# Altium schematic symbol library jlcpcb_2025_04_resistors_extended_0201.schlib: 1508 symbols (part 8 of 8) (continued)
## WR02X220JTL
designator R?  Resistance: 22Ω  (hidden comment: *)
Resistor, 22Ω, ±5%, 50mW, ±100ppm/℃, SMD 0201; Manufacturer: Uniroyal; Manufacturer Part Number: WR02X220JTL; Supplier 1: LCSC; Supplier Part Number 1: C367537; JLCPCB Part Number: C367537; Power Rating: 50mW; Category: Resistors; Package Size: 0201; JLCPCB Basic Part: Yes; Tolerance: ±5%; Temperature Coefficient: ±100ppm/℃; ComponentLink1Description: Datasheet; ComponentLink1URL: https://wmsc.lcsc.com/wmsc/upload/file/pdf/v2/lcsc/2304140030_Walsin-Tech-Corp-WR02X220JTL_C367537.pdf; ComponentLink2Description: JLCPCB Part URL; ComponentLink2URL: https://jlcpcb.com/partdetail/C367537
pins: 1, 2
1 alternate drawing of the same symbol

## WR02X221JALV
designator R?  Resistance: 220Ω  (hidden comment: *)
Resistor, 220Ω, ±5%, 50mW, ±200ppm/℃, SMD 0201; Manufacturer: Uniroyal; Manufacturer Part Number: WR02X221JALV; Supplier 1: LCSC; Supplier Part Number 1: C880848; JLCPCB Part Number: C880848; Power Rating: 50mW; Category: Resistors; Package Size: 0201; JLCPCB Basic Part: Yes; Tolerance: ±5%; Temperature Coefficient: ±200ppm/℃; ComponentLink1Description: Datasheet; ComponentLink1URL: https://wmsc.lcsc.com/wmsc/upload/file/pdf/v2/lcsc/2304140030_Walsin-Tech-Corp-WR02X221JALV_C880848.pdf; ComponentLink2Description: JLCPCB Part URL; ComponentLink2URL: https://jlcpcb.com/partdetail/C880848
pins: 1, 2
1 alternate drawing of the same symbol

## WR02X222JAL
designator R?  Resistance: 2.2kΩ  (hidden comment: *)
Resistor, 2.2kΩ, ±5%, 50mW, 25V, ±200ppm/℃, -55℃~+125℃, SMD 0201; Manufacturer: Uniroyal; Manufacturer Part Number: WR02X222JAL; Supplier 1: LCSC; Supplier Part Number 1: C171950; JLCPCB Part Number: C171950; Power Rating: 50mW; Category: Resistors; Package Size: 0201; JLCPCB Basic Part: Yes; Tolerance: ±5%; Voltage Rating: 25V; Temperature Coefficient: ±200ppm/℃; Temperature Rating: -55℃~+125℃; ComponentLink1Description: Datasheet; ComponentLink1URL: https://wmsc.lcsc.com/wmsc/upload/file/pdf/v2/lcsc/2304140030_Walsin-Tech-Corp-WR02X222JAL_C171950.pdf; ComponentLink2Description: JLCPCB Part URL; ComponentLink2URL: https://jlcpcb.com/partdetail/C171950
pins: 1, 2
1 alternate drawing of the same symbol

## WR02X243JAL
designator R?  Resistance: 24kΩ  (hidden comment: *)
Resistor, 24kΩ, ±5%, 50mW, 25V, ±200ppm/℃, -55℃~+125℃, SMD 0201; Manufacturer: Uniroyal; Manufacturer Part Number: WR02X243JAL; Supplier 1: LCSC; Supplier Part Number 1: C171955; JLCPCB Part Number: C171955; Power Rating: 50mW; Category: Resistors; Package Size: 0201; JLCPCB Basic Part: Yes; Tolerance: ±5%; Voltage Rating: 25V; Temperature Coefficient: ±200ppm/℃; Temperature Rating: -55℃~+125℃; ComponentLink1Description: Datasheet; ComponentLink1URL: https://wmsc.lcsc.com/wmsc/upload/file/pdf/v2/lcsc/2304140030_Walsin-Tech-Corp-WR02X243JAL_C171955.pdf; ComponentLink2Description: JLCPCB Part URL; ComponentLink2URL: https://jlcpcb.com/partdetail/C171955
pins: 1, 2
1 alternate drawing of the same symbol

## WR02X244JAL
designator R?  Resistance: 240kΩ  (hidden comment: *)
Resistor, 240kΩ, ±5%, 50mW, 25V, ±200ppm/℃, -55℃~+125℃, SMD 0201; Manufacturer: Uniroyal; Manufacturer Part Number: WR02X244JAL; Supplier 1: LCSC; Supplier Part Number 1: C334629; JLCPCB Part Number: C334629; Power Rating: 50mW; Category: Resistors; Package Size: 0201; JLCPCB Basic Part: Yes; Tolerance: ±5%; Voltage Rating: 25V; Temperature Coefficient: ±200ppm/℃; Temperature Rating: -55℃~+125℃; ComponentLink1Description: Datasheet; ComponentLink1URL: https://wmsc.lcsc.com/wmsc/upload/file/pdf/v2/lcsc/2304140030_Walsin-Tech-Corp-WR02X244JAL_C334629.pdf; ComponentLink2Description: JLCPCB Part URL; ComponentLink2URL: https://jlcpcb.com/partdetail/C334629
pins: 1, 2
1 alternate drawing of the same symbol

## WR02X303JAL
designator R?  Resistance: 30kΩ  (hidden comment: *)
Resistor, 30kΩ, ±5%, 50mW, ±200ppm/℃, -55℃~+125℃, SMD 0201; Manufacturer: Uniroyal; Manufacturer Part Number: WR02X303JAL; Supplier 1: LCSC; Supplier Part Number 1: C171960; JLCPCB Part Number: C171960; Power Rating: 50mW; Category: Resistors; Package Size: 0201; JLCPCB Basic Part: Yes; Tolerance: ±5%; Temperature Coefficient: ±200ppm/℃; Temperature Rating: -55℃~+125℃; ComponentLink1Description: Datasheet; ComponentLink1URL: https://wmsc.lcsc.com/wmsc/upload/file/pdf/v2/lcsc/2304140030_Walsin-Tech-Corp-WR02X303JAL_C171960.pdf; ComponentLink2Description: JLCPCB Part URL; ComponentLink2URL: https://jlcpcb.com/partdetail/C171960
pins: 1, 2
1 alternate drawing of the same symbol

## WR02X305JAL
designator R?  Resistance: 3MΩ  (hidden comment: *)
Resistor, 3MΩ, ±5%, 50mW, 25V, ±200ppm/℃, -55℃~+125℃, SMD 0201; Manufacturer: Uniroyal; Manufacturer Part Number: WR02X305JAL; Supplier 1: LCSC; Supplier Part Number 1: C2886138; JLCPCB Part Number: C2886138; Power Rating: 50mW; Category: Resistors; Package Size: 0201; JLCPCB Basic Part: Yes; Tolerance: ±5%; Voltage Rating: 25V; Temperature Coefficient: ±200ppm/℃; Temperature Rating: -55℃~+125℃; ComponentLink1Description: Datasheet; ComponentLink1URL: https://wmsc.lcsc.com/wmsc/upload/file/pdf/v2/lcsc/2108170930_Walsin-Tech-Corp-WR02X305JAL_C2886138.pdf; ComponentLink2Description: JLCPCB Part URL; ComponentLink2URL: https://jlcpcb.com/partdetail/C2886138
pins: 1, 2
1 alternate drawing of the same symbol

## WR02X362JAL
designator R?  Resistance: 3.6kΩ  (hidden comment: *)
Resistor, 3.6kΩ, ±5%, 50mW, 25V, ±200ppm/℃, -55℃~+125℃, SMD 0201; Manufacturer: Uniroyal; Manufacturer Part Number: WR02X362JAL; Supplier 1: LCSC; Supplier Part Number 1: C367600; JLCPCB Part Number: C367600; Power Rating: 50mW; Category: Resistors; Package Size: 0201; JLCPCB Basic Part: Yes; Tolerance: ±5%; Voltage Rating: 25V; Temperature Coefficient: ±200ppm/℃; Temperature Rating: -55℃~+125℃; ComponentLink1Description: Datasheet; ComponentLink1URL: https://wmsc.lcsc.com/wmsc/upload/file/pdf/v2/lcsc/2304140030_Walsin-Tech-Corp-WR02X362JAL_C367600.pdf; ComponentLink2Description: JLCPCB Part URL; ComponentLink2URL: https://jlcpcb.com/partdetail/C367600
pins: 1, 2
1 alternate drawing of the same symbol

## WR02X393JAL
designator R?  Resistance: 39kΩ  (hidden comment: *)
Resistor, 39kΩ, ±5%, 50mW, 25V, ±200ppm/℃, -55℃~+125℃, SMD 0201; Manufacturer: Uniroyal; Manufacturer Part Number: WR02X393JAL; Supplier 1: LCSC; Supplier Part Number 1: C171966; JLCPCB Part Number: C171966; Power Rating: 50mW; Category: Resistors; Package Size: 0201; JLCPCB Basic Part: Yes; Tolerance: ±5%; Voltage Rating: 25V; Temperature Coefficient: ±200ppm/℃; Temperature Rating: -55℃~+125℃; ComponentLink1Description: Datasheet; ComponentLink1URL: https://wmsc.lcsc.com/wmsc/upload/file/pdf/v2/lcsc/2304140030_Walsin-Tech-Corp-WR02X393JAL_C171966.pdf; ComponentLink2Description: JLCPCB Part URL; ComponentLink2URL: https://jlcpcb.com/partdetail/C171966
pins: 1, 2
1 alternate drawing of the same symbol

## WR02X510JALV
designator R?  Resistance: 51Ω  (hidden comment: *)
Resistor, 51Ω, ±5%, 50mW, 25V, ±200ppm/℃, -55℃~+125℃, SMD 0201; Manufacturer: Uniroyal; Manufacturer Part Number: WR02X510JALV; Supplier 1: LCSC; Supplier Part Number 1: C305290; JLCPCB Part Number: C305290; Power Rating: 50mW; Category: Resistors; Package Size: 0201; JLCPCB Basic Part: Yes; Tolerance: ±5%; Voltage Rating: 25V; Temperature Coefficient: ±200ppm/℃; Temperature Rating: -55℃~+125℃; ComponentLink1Description: Datasheet; ComponentLink1URL: https://wmsc.lcsc.com/wmsc/upload/file/pdf/v2/lcsc/2304140030_Walsin-Tech-Corp-WR02X510JALV_C305290.pdf; ComponentLink2Description: JLCPCB Part URL; ComponentLink2URL: https://jlcpcb.com/partdetail/C305290
pins: 1, 2
1 alternate drawing of the same symbol

## WR02X513JAL
designator R?  Resistance: 51kΩ  (hidden comment: *)
Resistor, 51kΩ, ±5%, 50mW, 25V, ±200ppm/℃, -55℃~+125℃, SMD 0201; Manufacturer: Uniroyal; Manufacturer Part Number: WR02X513JAL; Supplier 1: LCSC; Supplier Part Number 1: C171974; JLCPCB Part Number: C171974; Power Rating: 50mW; Category: Resistors; Package Size: 0201; JLCPCB Basic Part: Yes; Tolerance: ±5%; Voltage Rating: 25V; Temperature Coefficient: ±200ppm/℃; Temperature Rating: -55℃~+125℃; ComponentLink1Description: Datasheet; ComponentLink1URL: https://wmsc.lcsc.com/wmsc/upload/file/pdf/v2/lcsc/2304140030_Walsin-Tech-Corp-WR02X513JAL_C171974.pdf; ComponentLink2Description: JLCPCB Part URL; ComponentLink2URL: https://jlcpcb.com/partdetail/C171974
pins: 1, 2
1 alternate drawing of the same symbol

## WR02X514JAL
designator R?  Resistance: 510kΩ  (hidden comment: *)
Resistor, 510kΩ, ±5%, 50mW, 25V, ±200ppm/℃, -55℃~+125℃, SMD 0201; Manufacturer: Uniroyal; Manufacturer Part Number: WR02X514JAL; Supplier 1: LCSC; Supplier Part Number 1: C367650; JLCPCB Part Number: C367650; Power Rating: 50mW; Category: Resistors; Package Size: 0201; JLCPCB Basic Part: Yes; Tolerance: ±5%; Voltage Rating: 25V; Temperature Coefficient: ±200ppm/℃; Temperature Rating: -55℃~+125℃; ComponentLink1Description: Datasheet; ComponentLink1URL: https://wmsc.lcsc.com/wmsc/upload/file/pdf/v2/lcsc/2304140030_Walsin-Tech-Corp-WR02X514JAL_C367650.pdf; ComponentLink2Description: JLCPCB Part URL; ComponentLink2URL: https://jlcpcb.com/partdetail/C367650
pins: 1, 2
1 alternate drawing of the same symbol

## WR02X515JAL
designator R?  Resistance: 5.1MΩ  (hidden comment: *)
Resistor, 5.1MΩ, ±5%, 50mW, 25V, ±200ppm/℃, -55℃~+125℃, SMD 0201; Manufacturer: Uniroyal; Manufacturer Part Number: WR02X515JAL; Supplier 1: LCSC; Supplier Part Number 1: C171975; JLCPCB Part Number: C171975; Power Rating: 50mW; Category: Resistors; Package Size: 0201; JLCPCB Basic Part: Yes; Tolerance: ±5%; Voltage Rating: 25V; Temperature Coefficient: ±200ppm/℃; Temperature Rating: -55℃~+125℃; ComponentLink1Description: Datasheet; ComponentLink1URL: https://wmsc.lcsc.com/wmsc/upload/file/pdf/v2/lcsc/2304140030_Walsin-Tech-Corp-WR02X515JAL_C171975.pdf; ComponentLink2Description: JLCPCB Part URL; ComponentLink2URL: https://jlcpcb.com/partdetail/C171975
pins: 1, 2
1 alternate drawing of the same symbol

## WR02X562JTL
designator R?  Resistance: 5.6kΩ  (hidden comment: *)
Resistor, 5.6kΩ, ±5%, 50mW, 25V, ±100ppm/℃, -55℃~+125℃, SMD 0201; Manufacturer: Uniroyal; Manufacturer Part Number: WR02X562JTL; Supplier 1: LCSC; Supplier Part Number 1: C367659; JLCPCB Part Number: C367659; Power Rating: 50mW; Category: Resistors; Package Size: 0201; JLCPCB Basic Part: Yes; Tolerance: ±5%; Voltage Rating: 25V; Temperature Coefficient: ±100ppm/℃; Temperature Rating: -55℃~+125℃; ComponentLink1Description: Datasheet; ComponentLink1URL: https://wmsc.lcsc.com/wmsc/upload/file/pdf/v2/lcsc/2304140030_Walsin-Tech-Corp-WR02X562JTL_C367659.pdf; ComponentLink2Description: JLCPCB Part URL; ComponentLink2URL: https://jlcpcb.com/partdetail/C367659
pins: 1, 2
1 alternate drawing of the same symbol

## WR02X621 JAL
designator R?  Resistance: 620Ω  (hidden comment: *)
Resistor, 620Ω, ±5%, 50mW, 25V, ±200ppm/℃, -55℃~+125℃, SMD 0201; Manufacturer: Uniroyal; Manufacturer Part Number: WR02X621 JAL; Supplier 1: LCSC; Supplier Part Number 1: C2612282; JLCPCB Part Number: C2612282; Power Rating: 50mW; Category: Resistors; Package Size: 0201; JLCPCB Basic Part: Yes; Tolerance: ±5%; Voltage Rating: 25V; Temperature Coefficient: ±200ppm/℃; Temperature Rating: -55℃~+125℃; ComponentLink1Description: Datasheet; ComponentLink1URL: https://wmsc.lcsc.com/wmsc/upload/file/pdf/v2/lcsc/2304140030_Walsin-Tech-Corp-WR02X621-JAL_C2612282.pdf; ComponentLink2Description: JLCPCB Part URL; ComponentLink2URL: https://jlcpcb.com/partdetail/C2612282
pins: 1, 2
1 alternate drawing of the same symbol

## WR02X684JAL
designator R?  Resistance: 680kΩ  (hidden comment: *)
Resistor, 680kΩ, ±5%, 50mW, 25V, ±200ppm/℃, -55℃~+125℃, SMD 0201; Manufacturer: Uniroyal; Manufacturer Part Number: WR02X684JAL; Supplier 1: LCSC; Supplier Part Number 1: C334635; JLCPCB Part Number: C334635; Power Rating: 50mW; Category: Resistors; Package Size: 0201; JLCPCB Basic Part: Yes; Tolerance: ±5%; Voltage Rating: 25V; Temperature Coefficient: ±200ppm/℃; Temperature Rating: -55℃~+125℃; ComponentLink1Description: Datasheet; ComponentLink1URL: https://wmsc.lcsc.com/wmsc/upload/file/pdf/v2/lcsc/2304140030_Walsin-Tech-Corp-WR02X684JAL_C334635.pdf; ComponentLink2Description: JLCPCB Part URL; ComponentLink2URL: https://jlcpcb.com/partdetail/C334635
pins: 1, 2
1 alternate drawing of the same symbol

## WR02X913JAL
designator R?  Resistance: 91kΩ  (hidden comment: *)
Resistor, 91kΩ, ±5%, 50mW, 25V, ±200ppm/℃, -55℃~+125℃, SMD 0201; Manufacturer: Uniroyal; Manufacturer Part Number: WR02X913JAL; Supplier 1: LCSC; Supplier Part Number 1: C367710; JLCPCB Part Number: C367710; Power Rating: 50mW; Category: Resistors; Package Size: 0201; JLCPCB Basic Part: Yes; Tolerance: ±5%; Voltage Rating: 25V; Temperature Coefficient: ±200ppm/℃; Temperature Rating: -55℃~+125℃; ComponentLink1Description: Datasheet; ComponentLink1URL: https://wmsc.lcsc.com/wmsc/upload/file/pdf/v2/lcsc/2304140030_Walsin-Tech-Corp-WR02X913JAL_C367710.pdf; ComponentLink2Description: JLCPCB Part URL; ComponentLink2URL: https://jlcpcb.com/partdetail/C367710
pins: 1, 2
1 alternate drawing of the same symbol

## WR02X1000FAL
designator R?  Resistance: 100Ω  (hidden comment: *)
Resistor, 100Ω, ±1%, 50mW, 25V, ±200ppm/℃, -55℃~+125℃, SMD 0201; Manufacturer: Uniroyal; Manufacturer Part Number: WR02X1000FAL; Supplier 1: LCSC; Supplier Part Number 1: C180289; JLCPCB Part Number: C180289; Power Rating: 50mW; Category: Resistors; Package Size: 0201; JLCPCB Basic Part: Yes; Tolerance: ±1%; Voltage Rating: 25V; Temperature Coefficient: ±200ppm/℃; Temperature Rating: -55℃~+125℃; ComponentLink1Description: Datasheet; ComponentLink1URL: https://wmsc.lcsc.com/wmsc/upload/file/pdf/v2/lcsc/2304140030_Walsin-Tech-Corp-WR02X1000FAL_C180289.pdf; ComponentLink2Description: JLCPCB Part URL; ComponentLink2URL: https://jlcpcb.com/partdetail/C180289
pins: 1, 2
1 alternate drawing of the same symbol

## WR02X1002FAL
designator R?  Resistance: 10kΩ  (hidden comment: *)
Resistor, 10kΩ, ±1%, 50mW, 25V, ±200ppm/℃, -55℃~+125℃, SMD 0201; Manufacturer: Uniroyal; Manufacturer Part Number: WR02X1002FAL; Supplier 1: LCSC; Supplier Part Number 1: C170195; JLCPCB Part Number: C170195; Power Rating: 50mW; Category: Resistors; Package Size: 0201; JLCPCB Basic Part: Yes; Tolerance: ±1%; Voltage Rating: 25V; Temperature Coefficient: ±200ppm/℃; Temperature Rating: -55℃~+125℃; ComponentLink1Description: Datasheet; ComponentLink1URL: https://wmsc.lcsc.com/wmsc/upload/file/pdf/v2/lcsc/2304140030_Walsin-Tech-Corp-WR02X1002FAL_C170195.pdf; ComponentLink2Description: JLCPCB Part URL; ComponentLink2URL: https://jlcpcb.com/partdetail/C170195
pins: 1, 2
1 alternate drawing of the same symbol

## WR02X1051FAL
designator R?  Resistance: 1.05kΩ  (hidden comment: *)
Resistor, 1.05kΩ, ±1%, 50mW, 25V, ±200ppm/℃, -55℃~+125℃, SMD 0201; Manufacturer: Uniroyal; Manufacturer Part Number: WR02X1051FAL; Supplier 1: LCSC; Supplier Part Number 1: C384433; JLCPCB Part Number: C384433; Power Rating: 50mW; Category: Resistors; Package Size: 0201; JLCPCB Basic Part: Yes; Tolerance: ±1%; Voltage Rating: 25V; Temperature Coefficient: ±200ppm/℃; Temperature Rating: -55℃~+125℃; ComponentLink1Description: Datasheet; ComponentLink1URL: https://wmsc.lcsc.com/wmsc/upload/file/pdf/v2/lcsc/2304140030_Walsin-Tech-Corp-WR02X1051FAL_C384433.pdf; ComponentLink2Description: JLCPCB Part URL; ComponentLink2URL: https://jlcpcb.com/partdetail/C384433
pins: 1, 2
1 alternate drawing of the same symbol

## WR02X1101FAL
designator R?  Resistance: 1.1kΩ  (hidden comment: *)
Resistor, 1.1kΩ, ±1%, 50mW, 25V, ±200ppm/℃, -55℃~+125℃, SMD 0201; Manufacturer: Uniroyal; Manufacturer Part Number: WR02X1101FAL; Supplier 1: LCSC; Supplier Part Number 1: C384432; JLCPCB Part Number: C384432; Power Rating: 50mW; Category: Resistors; Package Size: 0201; JLCPCB Basic Part: Yes; Tolerance: ±1%; Voltage Rating: 25V; Temperature Coefficient: ±200ppm/℃; Temperature Rating: -55℃~+125℃; ComponentLink1Description: Datasheet; ComponentLink1URL: https://wmsc.lcsc.com/wmsc/upload/file/pdf/v2/lcsc/2304140030_Walsin-Tech-Corp-WR02X1101FAL_C384432.pdf; ComponentLink2Description: JLCPCB Part URL; ComponentLink2URL: https://jlcpcb.com/partdetail/C384432
pins: 1, 2
1 alternate drawing of the same symbol

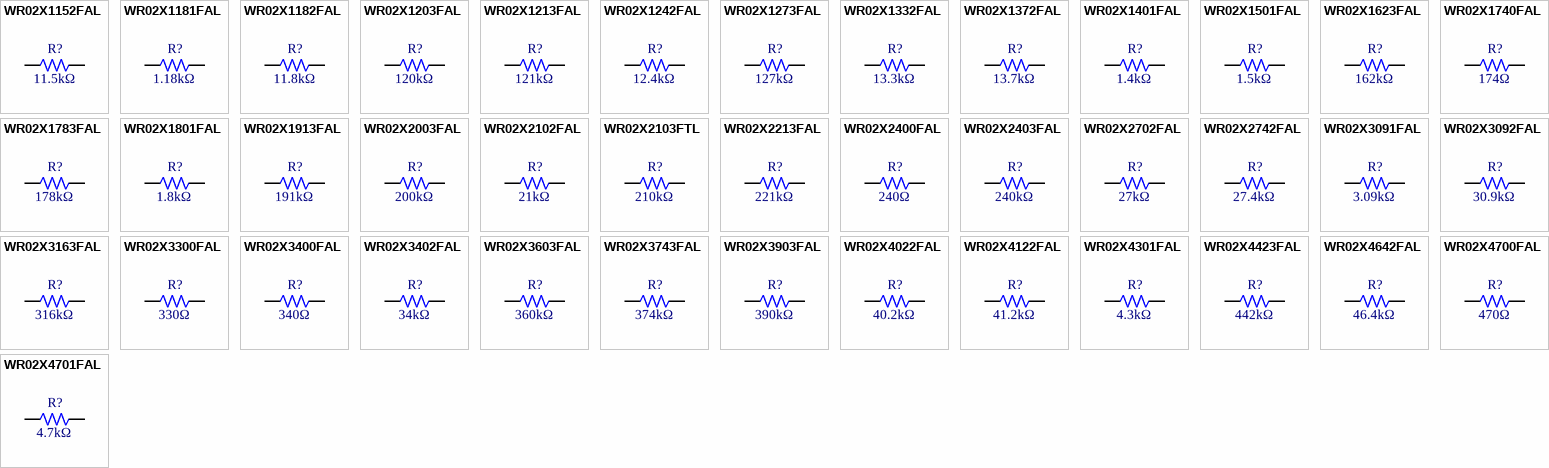
[diagram p36: symbols WR02X1152FAL to WR02X4701FAL]

## WR02X1152FAL
designator R?  Resistance: 11.5kΩ  (hidden comment: *)
Resistor, 11.5kΩ, ±1%, 50mW, 25V, ±200ppm/℃, -55℃~+125℃, SMD 0201; Manufacturer: Uniroyal; Manufacturer Part Number: WR02X1152FAL; Supplier 1: LCSC; Supplier Part Number 1: C2894203; JLCPCB Part Number: C2894203; Power Rating: 50mW; Category: Resistors; Package Size: 0201; JLCPCB Basic Part: Yes; Tolerance: ±1%; Voltage Rating: 25V; Temperature Coefficient: ±200ppm/℃; Temperature Rating: -55℃~+125℃; ComponentLink1Description: Datasheet; ComponentLink1URL: https://wmsc.lcsc.com/wmsc/upload/file/pdf/v2/lcsc/2109081830_Walsin-Tech-Corp-WR02X1152FAL_C2894203.pdf; ComponentLink2Description: JLCPCB Part URL; ComponentLink2URL: https://jlcpcb.com/partdetail/C2894203
pins: 1, 2
1 alternate drawing of the same symbol

## WR02X1181FAL
designator R?  Resistance: 1.18kΩ  (hidden comment: *)
Resistor, 1.18kΩ, ±1%, 50mW, 25V, ±200ppm/℃, -55℃~+125℃, SMD 0201; Manufacturer: Uniroyal; Manufacturer Part Number: WR02X1181FAL; Supplier 1: LCSC; Supplier Part Number 1: C367479; JLCPCB Part Number: C367479; Power Rating: 50mW; Category: Resistors; Package Size: 0201; JLCPCB Basic Part: Yes; Tolerance: ±1%; Voltage Rating: 25V; Temperature Coefficient: ±200ppm/℃; Temperature Rating: -55℃~+125℃; ComponentLink1Description: Datasheet; ComponentLink1URL: https://wmsc.lcsc.com/wmsc/upload/file/pdf/v2/lcsc/2304140030_Walsin-Tech-Corp-WR02X1181FAL_C367479.pdf; ComponentLink2Description: JLCPCB Part URL; ComponentLink2URL: https://jlcpcb.com/partdetail/C367479
pins: 1, 2
1 alternate drawing of the same symbol

## WR02X1182FAL
designator R?  Resistance: 11.8kΩ  (hidden comment: *)
Resistor, 11.8kΩ, ±1%, 50mW, 25V, ±200ppm/℃, -55℃~+125℃, SMD 0201; Manufacturer: Uniroyal; Manufacturer Part Number: WR02X1182FAL; Supplier 1: LCSC; Supplier Part Number 1: C2612393; JLCPCB Part Number: C2612393; Power Rating: 50mW; Category: Resistors; Package Size: 0201; JLCPCB Basic Part: Yes; Tolerance: ±1%; Voltage Rating: 25V; Temperature Coefficient: ±200ppm/℃; Temperature Rating: -55℃~+125℃; ComponentLink1Description: Datasheet; ComponentLink1URL: https://wmsc.lcsc.com/wmsc/upload/file/pdf/v2/lcsc/2304140030_Walsin-Tech-Corp-WR02X1182FAL_C2612393.pdf; ComponentLink2Description: JLCPCB Part URL; ComponentLink2URL: https://jlcpcb.com/partdetail/C2612393
pins: 1, 2
1 alternate drawing of the same symbol

## WR02X1203FAL
designator R?  Resistance: 120kΩ  (hidden comment: *)
Resistor, 120kΩ, ±1%, 50mW, 25V, ±100ppm/℃, -55℃~+125℃, SMD 0201; Manufacturer: Uniroyal; Manufacturer Part Number: WR02X1203FAL; Supplier 1: LCSC; Supplier Part Number 1: C367483; JLCPCB Part Number: C367483; Power Rating: 50mW; Category: Resistors; Package Size: 0201; JLCPCB Basic Part: Yes; Tolerance: ±1%; Voltage Rating: 25V; Temperature Coefficient: ±100ppm/℃; Temperature Rating: -55℃~+125℃; ComponentLink1Description: Datasheet; ComponentLink1URL: https://wmsc.lcsc.com/wmsc/upload/file/pdf/v2/lcsc/2304140030_Walsin-Tech-Corp-WR02X1203FAL_C367483.pdf; ComponentLink2Description: JLCPCB Part URL; ComponentLink2URL: https://jlcpcb.com/partdetail/C367483
pins: 1, 2
1 alternate drawing of the same symbol

## WR02X1213FAL
designator R?  Resistance: 121kΩ  (hidden comment: *)
Resistor, 121kΩ, ±1%, 50mW, 25V, ±200ppm/℃, -55℃~+125℃, SMD 0201; Manufacturer: Uniroyal; Manufacturer Part Number: WR02X1213FAL; Supplier 1: LCSC; Supplier Part Number 1: C367486; JLCPCB Part Number: C367486; Power Rating: 50mW; Category: Resistors; Package Size: 0201; JLCPCB Basic Part: Yes; Tolerance: ±1%; Voltage Rating: 25V; Temperature Coefficient: ±200ppm/℃; Temperature Rating: -55℃~+125℃; ComponentLink1Description: Datasheet; ComponentLink1URL: https://wmsc.lcsc.com/wmsc/upload/file/pdf/v2/lcsc/2304140030_Walsin-Tech-Corp-WR02X1213FAL_C367486.pdf; ComponentLink2Description: JLCPCB Part URL; ComponentLink2URL: https://jlcpcb.com/partdetail/C367486
pins: 1, 2
1 alternate drawing of the same symbol

## WR02X1242FAL
designator R?  Resistance: 12.4kΩ  (hidden comment: *)
Resistor, 12.4kΩ, ±1%, 50mW, 25V, ±200ppm/℃, -55℃~+125℃, SMD 0201; Manufacturer: Uniroyal; Manufacturer Part Number: WR02X1242FAL; Supplier 1: LCSC; Supplier Part Number 1: C2612358; JLCPCB Part Number: C2612358; Power Rating: 50mW; Category: Resistors; Package Size: 0201; JLCPCB Basic Part: Yes; Tolerance: ±1%; Voltage Rating: 25V; Temperature Coefficient: ±200ppm/℃; Temperature Rating: -55℃~+125℃; ComponentLink1Description: Datasheet; ComponentLink1URL: https://wmsc.lcsc.com/wmsc/upload/file/pdf/v2/lcsc/2304140030_Walsin-Tech-Corp-WR02X1242FAL_C2612358.pdf; ComponentLink2Description: JLCPCB Part URL; ComponentLink2URL: https://jlcpcb.com/partdetail/C2612358
pins: 1, 2
1 alternate drawing of the same symbol

## WR02X1273FAL
designator R?  Resistance: 127kΩ  (hidden comment: *)
Resistor, 127kΩ, ±1%, 50mW, 25V, ±100ppm/℃, -55℃~+125℃, SMD 0201; Manufacturer: Uniroyal; Manufacturer Part Number: WR02X1273FAL; Supplier 1: LCSC; Supplier Part Number 1: C367492; JLCPCB Part Number: C367492; Power Rating: 50mW; Category: Resistors; Package Size: 0201; JLCPCB Basic Part: Yes; Tolerance: ±1%; Voltage Rating: 25V; Temperature Coefficient: ±100ppm/℃; Temperature Rating: -55℃~+125℃; ComponentLink1Description: Datasheet; ComponentLink1URL: https://wmsc.lcsc.com/wmsc/upload/file/pdf/v2/lcsc/2304140030_Walsin-Tech-Corp-WR02X1273FAL_C367492.pdf; ComponentLink2Description: JLCPCB Part URL; ComponentLink2URL: https://jlcpcb.com/partdetail/C367492
pins: 1, 2
1 alternate drawing of the same symbol

## WR02X1332FAL
designator R?  Resistance: 13.3kΩ  (hidden comment: *)
Resistor, 13.3kΩ, ±1%, 50mW, 25V, ±200ppm/℃, -55℃~+125℃, SMD 0201; Manufacturer: Uniroyal; Manufacturer Part Number: WR02X1332FAL; Supplier 1: LCSC; Supplier Part Number 1: C367496; JLCPCB Part Number: C367496; Power Rating: 50mW; Category: Resistors; Package Size: 0201; JLCPCB Basic Part: Yes; Tolerance: ±1%; Voltage Rating: 25V; Temperature Coefficient: ±200ppm/℃; Temperature Rating: -55℃~+125℃; ComponentLink1Description: Datasheet; ComponentLink1URL: https://wmsc.lcsc.com/wmsc/upload/file/pdf/v2/lcsc/2304140030_Walsin-Tech-Corp-WR02X1332FAL_C367496.pdf; ComponentLink2Description: JLCPCB Part URL; ComponentLink2URL: https://jlcpcb.com/partdetail/C367496
pins: 1, 2
1 alternate drawing of the same symbol

## WR02X1372FAL
designator R?  Resistance: 13.7kΩ  (hidden comment: *)
Resistor, 13.7kΩ, ±1%, 50mW, 25V, ±200ppm/℃, -55℃~+125℃, SMD 0201; Manufacturer: Uniroyal; Manufacturer Part Number: WR02X1372FAL; Supplier 1: LCSC; Supplier Part Number 1: C367498; JLCPCB Part Number: C367498; Power Rating: 50mW; Category: Resistors; Package Size: 0201; JLCPCB Basic Part: Yes; Tolerance: ±1%; Voltage Rating: 25V; Temperature Coefficient: ±200ppm/℃; Temperature Rating: -55℃~+125℃; ComponentLink1Description: Datasheet; ComponentLink1URL: https://wmsc.lcsc.com/wmsc/upload/file/pdf/v2/lcsc/2304140030_Walsin-Tech-Corp-WR02X1372FAL_C367498.pdf; ComponentLink2Description: JLCPCB Part URL; ComponentLink2URL: https://jlcpcb.com/partdetail/C367498
pins: 1, 2
1 alternate drawing of the same symbol

## WR02X1401FAL
designator R?  Resistance: 1.4kΩ  (hidden comment: *)
Resistor, 1.4kΩ, ±1%, 50mW, 25V, ±200ppm/℃, -55℃~+125℃, SMD 0201; Manufacturer: Uniroyal; Manufacturer Part Number: WR02X1401FAL; Supplier 1: LCSC; Supplier Part Number 1: C367499; JLCPCB Part Number: C367499; Power Rating: 50mW; Category: Resistors; Package Size: 0201; JLCPCB Basic Part: Yes; Tolerance: ±1%; Voltage Rating: 25V; Temperature Coefficient: ±200ppm/℃; Temperature Rating: -55℃~+125℃; ComponentLink1Description: Datasheet; ComponentLink1URL: https://wmsc.lcsc.com/wmsc/upload/file/pdf/v2/lcsc/2304140030_Walsin-Tech-Corp-WR02X1401FAL_C367499.pdf; ComponentLink2Description: JLCPCB Part URL; ComponentLink2URL: https://jlcpcb.com/partdetail/C367499
pins: 1, 2
1 alternate drawing of the same symbol

## WR02X1501FAL
designator R?  Resistance: 1.5kΩ  (hidden comment: *)
Resistor, 1.5kΩ, ±1%, 50mW, 25V, ±200ppm/℃, -55℃~+125℃, SMD 0201; Manufacturer: Uniroyal; Manufacturer Part Number: WR02X1501FAL; Supplier 1: LCSC; Supplier Part Number 1: C334600; JLCPCB Part Number: C334600; Power Rating: 50mW; Category: Resistors; Package Size: 0201; JLCPCB Basic Part: Yes; Tolerance: ±1%; Voltage Rating: 25V; Temperature Coefficient: ±200ppm/℃; Temperature Rating: -55℃~+125℃; ComponentLink1Description: Datasheet; ComponentLink1URL: https://wmsc.lcsc.com/wmsc/upload/file/pdf/v2/lcsc/2304140030_Walsin-Tech-Corp-WR02X1501FAL_C334600.pdf; ComponentLink2Description: JLCPCB Part URL; ComponentLink2URL: https://jlcpcb.com/partdetail/C334600
pins: 1, 2
1 alternate drawing of the same symbol

## WR02X1623FAL
designator R?  Resistance: 162kΩ  (hidden comment: *)
Resistor, 162kΩ, ±1%, 50mW, 25V, ±200ppm/℃, -55℃~+125℃, SMD 0201; Manufacturer: Uniroyal; Manufacturer Part Number: WR02X1623FAL; Supplier 1: LCSC; Supplier Part Number 1: C2612385; JLCPCB Part Number: C2612385; Power Rating: 50mW; Category: Resistors; Package Size: 0201; JLCPCB Basic Part: Yes; Tolerance: ±1%; Voltage Rating: 25V; Temperature Coefficient: ±200ppm/℃; Temperature Rating: -55℃~+125℃; ComponentLink1Description: Datasheet; ComponentLink1URL: https://wmsc.lcsc.com/wmsc/upload/file/pdf/v2/lcsc/2304140030_Walsin-Tech-Corp-WR02X1623FAL_C2612385.pdf; ComponentLink2Description: JLCPCB Part URL; ComponentLink2URL: https://jlcpcb.com/partdetail/C2612385
pins: 1, 2
1 alternate drawing of the same symbol

## WR02X1740FAL
designator R?  Resistance: 174Ω  (hidden comment: *)
Resistor, 174Ω, ±1%, 50mW, 25V, ±200ppm/℃, -55℃~+125℃, SMD 0201; Manufacturer: Uniroyal; Manufacturer Part Number: WR02X1740FAL; Supplier 1: LCSC; Supplier Part Number 1: C367514; JLCPCB Part Number: C367514; Power Rating: 50mW; Category: Resistors; Package Size: 0201; JLCPCB Basic Part: Yes; Tolerance: ±1%; Voltage Rating: 25V; Temperature Coefficient: ±200ppm/℃; Temperature Rating: -55℃~+125℃; ComponentLink1Description: Datasheet; ComponentLink1URL: https://wmsc.lcsc.com/wmsc/upload/file/pdf/v2/lcsc/2304140030_Walsin-Tech-Corp-WR02X1740FAL_C367514.pdf; ComponentLink2Description: JLCPCB Part URL; ComponentLink2URL: https://jlcpcb.com/partdetail/C367514
pins: 1, 2
1 alternate drawing of the same symbol

## WR02X1783FAL
designator R?  Resistance: 178kΩ  (hidden comment: *)
Resistor, 178kΩ, ±1%, 50mW, 25V, ±200ppm/℃, -55℃~+125℃, SMD 0201; Manufacturer: Uniroyal; Manufacturer Part Number: WR02X1783FAL; Supplier 1: LCSC; Supplier Part Number 1: C2612296; JLCPCB Part Number: C2612296; Power Rating: 50mW; Category: Resistors; Package Size: 0201; JLCPCB Basic Part: Yes; Tolerance: ±1%; Voltage Rating: 25V; Temperature Coefficient: ±200ppm/℃; Temperature Rating: -55℃~+125℃; ComponentLink1Description: Datasheet; ComponentLink1URL: https://wmsc.lcsc.com/wmsc/upload/file/pdf/v2/lcsc/2304140030_Walsin-Tech-Corp-WR02X1783FAL_C2612296.pdf; ComponentLink2Description: JLCPCB Part URL; ComponentLink2URL: https://jlcpcb.com/partdetail/C2612296
pins: 1, 2
1 alternate drawing of the same symbol

## WR02X1801FAL
designator R?  Resistance: 1.8kΩ  (hidden comment: *)
Resistor, 1.8kΩ, ±1%, 50mW, 25V, ±200ppm/℃, -55℃~+125℃, SMD 0201; Manufacturer: Uniroyal; Manufacturer Part Number: WR02X1801FAL; Supplier 1: LCSC; Supplier Part Number 1: C2894202; JLCPCB Part Number: C2894202; Power Rating: 50mW; Category: Resistors; Package Size: 0201; JLCPCB Basic Part: Yes; Tolerance: ±1%; Voltage Rating: 25V; Temperature Coefficient: ±200ppm/℃; Temperature Rating: -55℃~+125℃; ComponentLink1Description: Datasheet; ComponentLink1URL: https://wmsc.lcsc.com/wmsc/upload/file/pdf/v2/lcsc/2109081830_Walsin-Tech-Corp-WR02X1801FAL_C2894202.pdf; ComponentLink2Description: JLCPCB Part URL; ComponentLink2URL: https://jlcpcb.com/partdetail/C2894202
pins: 1, 2
1 alternate drawing of the same symbol

## WR02X1913FAL
designator R?  Resistance: 191kΩ  (hidden comment: *)
Resistor, 191kΩ, ±1%, 50mW, 25V, ±100ppm/℃, -55℃~+125℃, SMD 0201; Manufacturer: Uniroyal; Manufacturer Part Number: WR02X1913FAL; Supplier 1: LCSC; Supplier Part Number 1: C367528; JLCPCB Part Number: C367528; Power Rating: 50mW; Category: Resistors; Package Size: 0201; JLCPCB Basic Part: Yes; Tolerance: ±1%; Voltage Rating: 25V; Temperature Coefficient: ±100ppm/℃; Temperature Rating: -55℃~+125℃; ComponentLink1Description: Datasheet; ComponentLink1URL: https://wmsc.lcsc.com/wmsc/upload/file/pdf/v2/lcsc/2304140030_Walsin-Tech-Corp-WR02X1913FAL_C367528.pdf; ComponentLink2Description: JLCPCB Part URL; ComponentLink2URL: https://jlcpcb.com/partdetail/C367528
pins: 1, 2
1 alternate drawing of the same symbol

## WR02X2003FAL
designator R?  Resistance: 200kΩ  (hidden comment: *)
Resistor, 200kΩ, ±1%, 50mW, 25V, ±200ppm/℃, -55℃~+125℃, SMD 0201; Manufacturer: Uniroyal; Manufacturer Part Number: WR02X2003FAL; Supplier 1: LCSC; Supplier Part Number 1: C171922; JLCPCB Part Number: C171922; Power Rating: 50mW; Category: Resistors; Package Size: 0201; JLCPCB Basic Part: Yes; Tolerance: ±1%; Voltage Rating: 25V; Temperature Coefficient: ±200ppm/℃; Temperature Rating: -55℃~+125℃; ComponentLink1Description: Datasheet; ComponentLink1URL: https://wmsc.lcsc.com/wmsc/upload/file/pdf/v2/lcsc/2304140030_Walsin-Tech-Corp-WR02X2003FAL_C171922.pdf; ComponentLink2Description: JLCPCB Part URL; ComponentLink2URL: https://jlcpcb.com/partdetail/C171922
pins: 1, 2
1 alternate drawing of the same symbol

## WR02X2102FAL
designator R?  Resistance: 21kΩ  (hidden comment: *)
Resistor, 21kΩ, ±1%, 50mW, 25V, ±200ppm/℃, -55℃~+125℃, SMD 0201; Manufacturer: Uniroyal; Manufacturer Part Number: WR02X2102FAL; Supplier 1: LCSC; Supplier Part Number 1: C364164; JLCPCB Part Number: C364164; Power Rating: 50mW; Category: Resistors; Package Size: 0201; JLCPCB Basic Part: Yes; Tolerance: ±1%; Voltage Rating: 25V; Temperature Coefficient: ±200ppm/℃; Temperature Rating: -55℃~+125℃; ComponentLink1Description: Datasheet; ComponentLink1URL: https://wmsc.lcsc.com/wmsc/upload/file/pdf/v2/lcsc/2404071659_Walsin-Tech-Corp-WR02X2102FAL_C364164.pdf; ComponentLink2Description: JLCPCB Part URL; ComponentLink2URL: https://jlcpcb.com/partdetail/C364164
pins: 1, 2
1 alternate drawing of the same symbol

## WR02X2103FTL
designator R?  Resistance: 210kΩ  (hidden comment: *)
Resistor, 210kΩ, ±1%, 50mW, 25V, ±100ppm/℃, -55℃~+125℃, SMD 0201; Manufacturer: Uniroyal; Manufacturer Part Number: WR02X2103FTL; Supplier 1: LCSC; Supplier Part Number 1: C367534; JLCPCB Part Number: C367534; Power Rating: 50mW; Category: Resistors; Package Size: 0201; JLCPCB Basic Part: Yes; Tolerance: ±1%; Voltage Rating: 25V; Temperature Coefficient: ±100ppm/℃; Temperature Rating: -55℃~+125℃; ComponentLink1Description: Datasheet; ComponentLink1URL: https://wmsc.lcsc.com/wmsc/upload/file/pdf/v2/lcsc/2304140030_Walsin-Tech-Corp-WR02X2103FTL_C367534.pdf; ComponentLink2Description: JLCPCB Part URL; ComponentLink2URL: https://jlcpcb.com/partdetail/C367534
pins: 1, 2
1 alternate drawing of the same symbol

## WR02X2213FAL
designator R?  Resistance: 221kΩ  (hidden comment: *)
Resistor, 221kΩ, ±1%, 50mW, 25V, ±200ppm/℃, -55℃~+125℃, SMD 0201; Manufacturer: Uniroyal; Manufacturer Part Number: WR02X2213FAL; Supplier 1: LCSC; Supplier Part Number 1: C2612374; JLCPCB Part Number: C2612374; Power Rating: 50mW; Category: Resistors; Package Size: 0201; JLCPCB Basic Part: Yes; Tolerance: ±1%; Voltage Rating: 25V; Temperature Coefficient: ±200ppm/℃; Temperature Rating: -55℃~+125℃; ComponentLink1Description: Datasheet; ComponentLink1URL: https://wmsc.lcsc.com/wmsc/upload/file/pdf/v2/lcsc/2304140030_Walsin-Tech-Corp-WR02X2213FAL_C2612374.pdf; ComponentLink2Description: JLCPCB Part URL; ComponentLink2URL: https://jlcpcb.com/partdetail/C2612374
pins: 1, 2
1 alternate drawing of the same symbol

## WR02X2400FAL
designator R?  Resistance: 240Ω  (hidden comment: *)
Resistor, 240Ω, ±1%, 50mW, 25V, ±200ppm/℃, -55℃~+125℃, SMD 0201; Manufacturer: Uniroyal; Manufacturer Part Number: WR02X2400FAL; Supplier 1: LCSC; Supplier Part Number 1: C334607; JLCPCB Part Number: C334607; Power Rating: 50mW; Category: Resistors; Package Size: 0201; JLCPCB Basic Part: Yes; Tolerance: ±1%; Voltage Rating: 25V; Temperature Coefficient: ±200ppm/℃; Temperature Rating: -55℃~+125℃; ComponentLink1Description: Datasheet; ComponentLink1URL: https://wmsc.lcsc.com/wmsc/upload/file/pdf/v2/lcsc/2304140030_Walsin-Tech-Corp-WR02X2400FAL_C334607.pdf; ComponentLink2Description: JLCPCB Part URL; ComponentLink2URL: https://jlcpcb.com/partdetail/C334607
pins: 1, 2
1 alternate drawing of the same symbol

## WR02X2403FAL
designator R?  Resistance: 240kΩ  (hidden comment: *)
Resistor, 240kΩ, ±1%, 50mW, 25V, ±200ppm/℃, -55℃~+125℃, SMD 0201; Manufacturer: Uniroyal; Manufacturer Part Number: WR02X2403FAL; Supplier 1: LCSC; Supplier Part Number 1: C2894206; JLCPCB Part Number: C2894206; Power Rating: 50mW; Category: Resistors; Package Size: 0201; JLCPCB Basic Part: Yes; Tolerance: ±1%; Voltage Rating: 25V; Temperature Coefficient: ±200ppm/℃; Temperature Rating: -55℃~+125℃; ComponentLink1Description: Datasheet; ComponentLink1URL: https://wmsc.lcsc.com/wmsc/upload/file/pdf/v2/lcsc/2109081830_Walsin-Tech-Corp-WR02X2403FAL_C2894206.pdf; ComponentLink2Description: JLCPCB Part URL; ComponentLink2URL: https://jlcpcb.com/partdetail/C2894206
pins: 1, 2
1 alternate drawing of the same symbol

## WR02X2702FAL
designator R?  Resistance: 27kΩ  (hidden comment: *)
Resistor, 27kΩ, ±1%, 50mW, 25V, ±200ppm/℃, -55℃~+125℃, SMD 0201; Manufacturer: Uniroyal; Manufacturer Part Number: WR02X2702FAL; Supplier 1: LCSC; Supplier Part Number 1: C364165; JLCPCB Part Number: C364165; Power Rating: 50mW; Category: Resistors; Package Size: 0201; JLCPCB Basic Part: Yes; Tolerance: ±1%; Voltage Rating: 25V; Temperature Coefficient: ±200ppm/℃; Temperature Rating: -55℃~+125℃; ComponentLink1Description: Datasheet; ComponentLink1URL: https://wmsc.lcsc.com/wmsc/upload/file/pdf/v2/lcsc/2304140030_Walsin-Tech-Corp-WR02X2702FAL_C364165.pdf; ComponentLink2Description: JLCPCB Part URL; ComponentLink2URL: https://jlcpcb.com/partdetail/C364165
pins: 1, 2
1 alternate drawing of the same symbol
